# Altium footprint library Global Library.PcbLib: 97 footprints (part 3 of 7)
Each footprint in its own frame and in the unit in brackets; x right, y up, seen from the top. Pads: shape width x height; smd on the part's side, far side on the other; paste and mask are expansions set on the pad; w line width, h text height; cw(c..) or ccw(c..) is an arc to the next point about the centre after c.
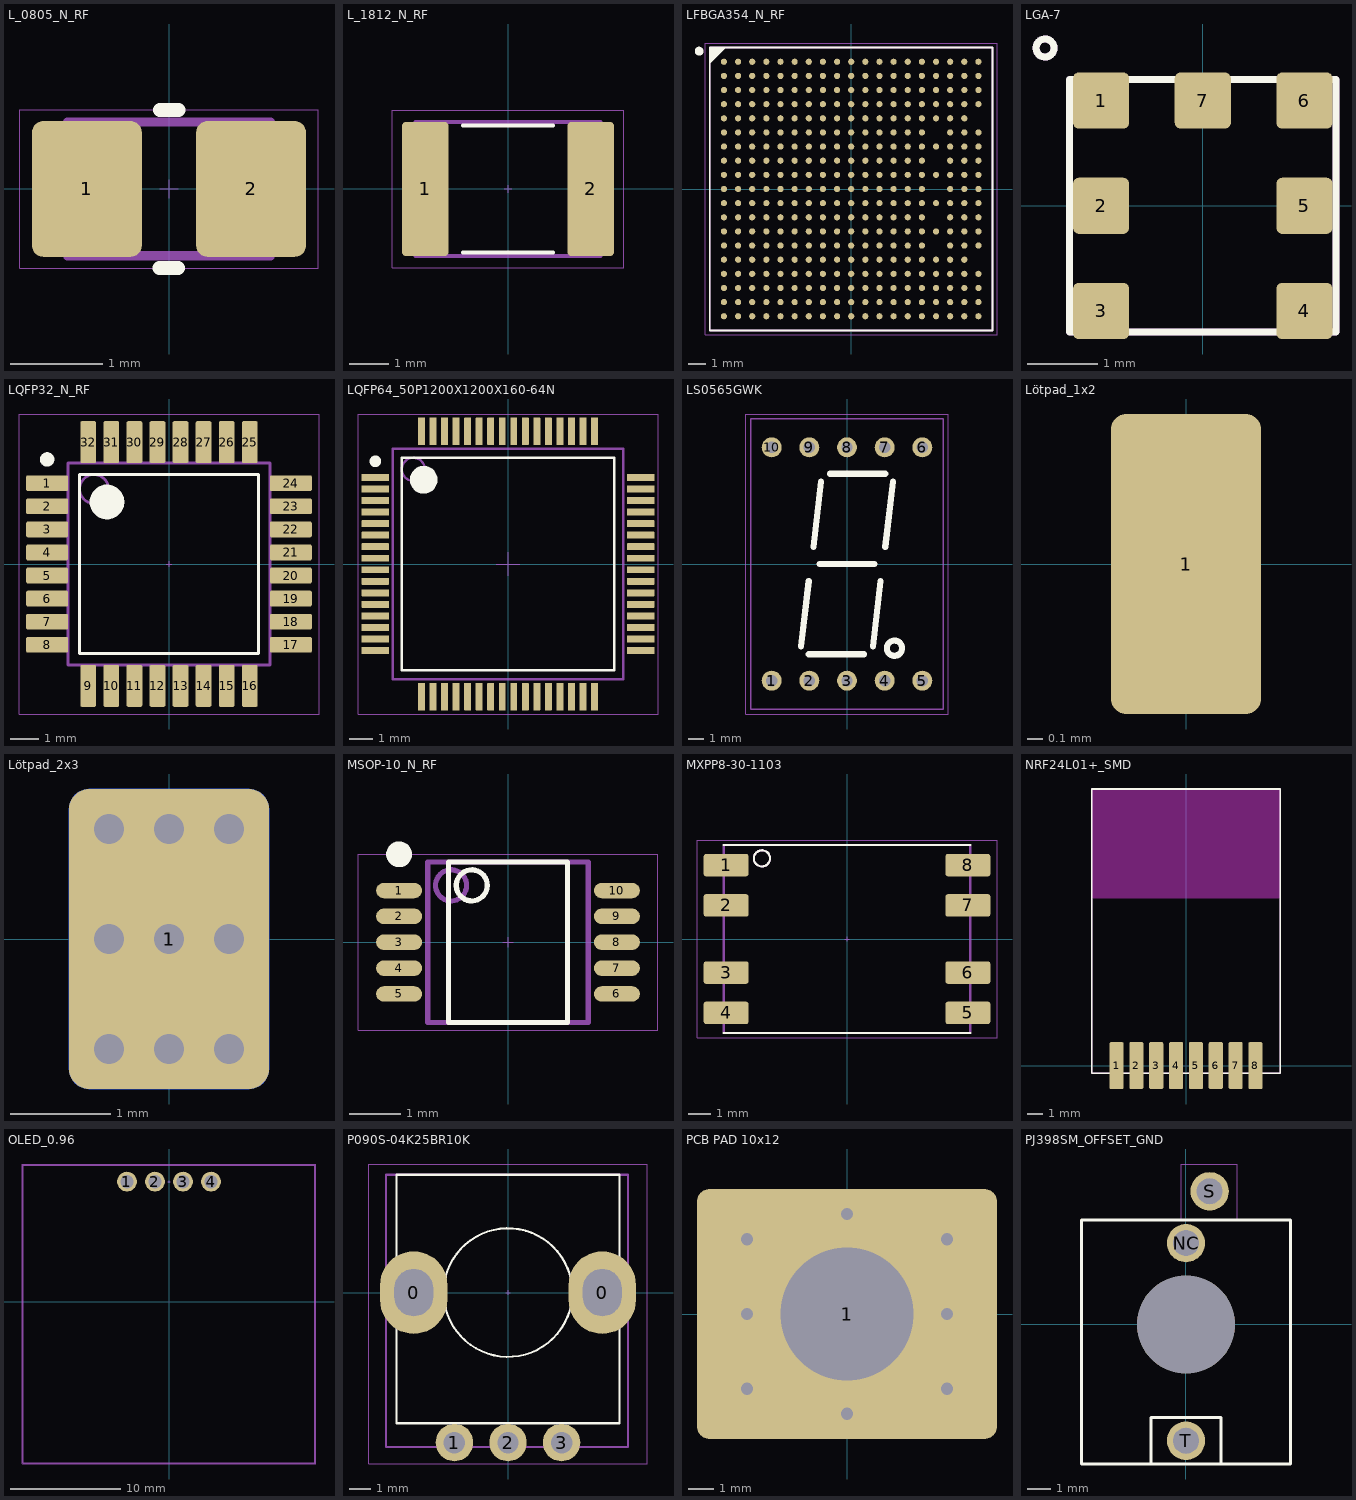
[diagram p2: the footprints below, top view; thin cyan lines are the x and y axes]

## L_0805_N_RF [mm]
pads (2):
  rrect20% 1.19x1.47 smd: 1(-0.89,0) 2(0.89,0)
Top Overlay:
  lines w0.15: -0.101,-0.857 0.099,-0.857 ; -0.099,0.857 0.101,0.857
Top Courtyard:
  lines w0.01: -0.1,0 0.1,0 ; 0,-0.1 0,0.1 ; -1.618,-0.858 1.615,-0.858 1.615,0.857 -1.618,0.857 -1.618,-0.858
Top Assembly:
  lines w0.1: -1.1,-0.725 1.1,-0.725 1.1,0.725 -1.1,0.725 -1.1,-0.725
Top Assy SMT:
  lines w0.1: -1.1,-0.725 1.1,-0.725 1.1,0.725 -1.1,0.725 -1.1,-0.725
  text ".Designator" at -1.1,1 h1
3D body "INDC0805X09L.step": height 0.9, standoff 0, extent -1.1,-0.725 1.1,0.725

## L_1812_N_RF [mm] "Chip Inductor, 2-Leads, Body 4.50x3.20mm, IPC Medium Density"
height 1.7
pads (2):
  rrect20% 1.19x3.42 smd: 1(-2.105,0) 2(2.105,0)
Top Overlay:
  lines w0.1: -1.15,-1.61 1.15,-1.61 ; -1.15,1.61 1.15,1.61
Top Courtyard:
  lines w0.01: -0.1,0 0.1,0 ; 0,-0.1 0,0.1 ; -2.95,-2 2.95,-2 2.95,2 -2.95,2 -2.95,-2
Top Assembly:
  lines w0.1: -2.35,-1.7 2.35,-1.7 2.35,1.7 -2.35,1.7 -2.35,-1.7
Top Assy SMT:
  lines w0.1: -2.35,-1.7 2.35,-1.7 2.35,1.7 -2.35,1.7 -2.35,-1.7
  text ".Designator" at -2.6,2.1 h1
3D body "L_1812_N_RF.step": height 1.7, standoff 0, extent -2.35,-1.7 2.35,1.7

## LFBGA354_N_RF [mm] "BGA, 354-Leads, Body 16.00x16.00mmx1.29mm, Pitch 0.80mm"
height 1.29
pads (354):
  round 0.35 smd: A1(-7.2,7.2) A2(-6.4,7.2) A3(-5.6,7.2) A4(-4.8,7.2) A5(-4,7.2) A6(-3.2,7.2) A7(-2.4,7.2) A8(-1.6,7.2) A9(-0.8,7.2) A10(0,7.2) A11(0.8,7.2) A12(1.6,7.2) A13(2.4,7.2) A14(3.2,7.2) A15(4,7.2) A16(4.8,7.2) A17(5.6,7.2) A18(6.4,7.2) A19(7.2,7.2) B1(-7.2,6.4) B2(-6.4,6.4) B3(-5.6,6.4) B4(-4.8,6.4) B5(-4,6.4) B6(-3.2,6.4) B7(-2.4,6.4) B8(-1.6,6.4) B9(-0.8,6.4) B10(0,6.4) B11(0.8,6.4) B12(1.6,6.4) B13(2.4,6.4) B14(3.2,6.4) B15(4,6.4) B16(4.8,6.4) B17(5.6,6.4) B18(6.4,6.4) B19(7.2,6.4) C1(-7.2,5.6) C2(-6.4,5.6) C3(-5.6,5.6) C4(-4.8,5.6) C5(-4,5.6) C6(-3.2,5.6) C7(-2.4,5.6) C8(-1.6,5.6) C9(-0.8,5.6) C10(0,5.6) C11(0.8,5.6) C12(1.6,5.6) C13(2.4,5.6) C14(3.2,5.6) C15(4,5.6) C16(4.8,5.6) C17(5.6,5.6) C18(6.4,5.6) C19(7.2,5.6) D1(-7.2,4.8) D2(-6.4,4.8) D3(-5.6,4.8) D4(-4.8,4.8) D5(-4,4.8) D6(-3.2,4.8) D7(-2.4,4.8) D8(-1.6,4.8) D9(-0.8,4.8) D10(0,4.8) D11(0.8,4.8) D12(1.6,4.8) D13(2.4,4.8) D14(3.2,4.8) D15(4,4.8) D16(4.8,4.8) D17(5.6,4.8) D18(6.4,4.8) D19(7.2,4.8) E1(-7.2,4) E2(-6.4,4) E3(-5.6,4) E4(-4.8,4) E5(-4,4) E6(-3.2,4) E7(-2.4,4) E8(-1.6,4) E9(-0.8,4) E10(0,4) E11(0.8,4) E12(1.6,4) E13(2.4,4) E14(3.2,4) E15(4,4) E16(4.8,4) E17(5.6,4) E18(6.4,4) F1(-7.2,3.2) F2(-6.4,3.2) F3(-5.6,3.2) F4(-4.8,3.2) F5(-4,3.2) F6(-3.2,3.2) F7(-2.4,3.2) F8(-1.6,3.2) F9(-0.8,3.2) F10(0,3.2) F11(0.8,3.2) F12(1.6,3.2) F13(2.4,3.2) F14(3.2,3.2) F15(4,3.2) F17(5.6,3.2) F18(6.4,3.2) F19(7.2,3.2) G1(-7.2,2.4) G2(-6.4,2.4) G3(-5.6,2.4) G4(-4.8,2.4) G5(-4,2.4) G6(-3.2,2.4) G7(-2.4,2.4) G8(-1.6,2.4) G9(-0.8,2.4) G10(0,2.4) G11(0.8,2.4) G12(1.6,2.4) G13(2.4,2.4) G14(3.2,2.4) G15(4,2.4) G16(4.8,2.4) G17(5.6,2.4) G18(6.4,2.4) G19(7.2,2.4) H1(-7.2,1.6) H2(-6.4,1.6) H3(-5.6,1.6) H4(-4.8,1.6) H5(-4,1.6) H6(-3.2,1.6) H7(-2.4,1.6) H8(-1.6,1.6) H9(-0.8,1.6) H10(0,1.6) H11(0.8,1.6) H12(1.6,1.6) H13(2.4,1.6) H14(3.2,1.6) H15(4,1.6) H17(5.6,1.6) H18(6.4,1.6) H19(7.2,1.6) J1(-7.2,0.8) J2(-6.4,0.8) J3(-5.6,0.8) J4(-4.8,0.8) J5(-4,0.8) J6(-3.2,0.8) J7(-2.4,0.8) J8(-1.6,0.8) J9(-0.8,0.8) J10(0,0.8) J11(0.8,0.8) J12(1.6,0.8) J13(2.4,0.8) J14(3.2,0.8) J15(4,0.8) J16(4.8,0.8) J17(5.6,0.8) J18(6.4,0.8) J19(7.2,0.8) K1(-7.2,0) K2(-6.4,0) K3(-5.6,0) K4(-4.8,0) K5(-4,0) K6(-3.2,0) K7(-2.4,0) K8(-1.6,0) K9(-0.8,0) K10(0,0) K11(0.8,0) K12(1.6,0) K13(2.4,0) K14(3.2,0) K15(4,0) K17(5.6,0) K18(6.4,0) K19(7.2,0) L1(-7.2,-0.8) L2(-6.4,-0.8) L3(-5.6,-0.8) L4(-4.8,-0.8) L5(-4,-0.8) L6(-3.2,-0.8) L7(-2.4,-0.8) L8(-1.6,-0.8) L9(-0.8,-0.8) L10(0,-0.8) L11(0.8,-0.8) L12(1.6,-0.8) L13(2.4,-0.8) L14(3.2,-0.8) L15(4,-0.8) L16(4.8,-0.8) L17(5.6,-0.8) L18(6.4,-0.8) L19(7.2,-0.8) M1(-7.2,-1.6) M2(-6.4,-1.6) M3(-5.6,-1.6) M4(-4.8,-1.6) M5(-4,-1.6) M6(-3.2,-1.6) M7(-2.4,-1.6) M8(-1.6,-1.6) M9(-0.8,-1.6) M10(0,-1.6) M11(0.8,-1.6) M12(1.6,-1.6) M13(2.4,-1.6) M14(3.2,-1.6) M15(4,-1.6) M17(5.6,-1.6) M18(6.4,-1.6) M19(7.2,-1.6) N1(-7.2,-2.4) N2(-6.4,-2.4) N3(-5.6,-2.4) N4(-4.8,-2.4) N5(-4,-2.4) N6(-3.2,-2.4) N7(-2.4,-2.4) N8(-1.6,-2.4) N9(-0.8,-2.4) N10(0,-2.4) N11(0.8,-2.4) N12(1.6,-2.4) N13(2.4,-2.4) N14(3.2,-2.4) N15(4,-2.4) N16(4.8,-2.4) N17(5.6,-2.4) N18(6.4,-2.4) N19(7.2,-2.4) P1(-7.2,-3.2) P2(-6.4,-3.2) P3(-5.6,-3.2) P4(-4.8,-3.2) P5(-4,-3.2) P6(-3.2,-3.2) P7(-2.4,-3.2) P8(-1.6,-3.2) P9(-0.8,-3.2) P10(0,-3.2) P11(0.8,-3.2) P12(1.6,-3.2) P13(2.4,-3.2) P14(3.2,-3.2) P15(4,-3.2) P17(5.6,-3.2) P18(6.4,-3.2) P19(7.2,-3.2) R1(-7.2,-4) R2(-6.4,-4) R3(-5.6,-4) R4(-4.8,-4) R5(-4,-4) R6(-3.2,-4) R7(-2.4,-4) R8(-1.6,-4) R9(-0.8,-4) R10(0,-4) R11(0.8,-4) R12(1.6,-4) R13(2.4,-4) R14(3.2,-4) R15(4,-4) R16(4.8,-4) R17(5.6,-4) R18(6.4,-4) T1(-7.2,-4.8) T2(-6.4,-4.8) T3(-5.6,-4.8) T4(-4.8,-4.8) T5(-4,-4.8) T6(-3.2,-4.8) T7(-2.4,-4.8) T8(-1.6,-4.8) T9(-0.8,-4.8) T10(0,-4.8) T11(0.8,-4.8) T12(1.6,-4.8) T13(2.4,-4.8) T14(3.2,-4.8) T15(4,-4.8) T16(4.8,-4.8) T17(5.6,-4.8) T18(6.4,-4.8) T19(7.2,-4.8) U1(-7.2,-5.6) U2(-6.4,-5.6) U3(-5.6,-5.6) U4(-4.8,-5.6) U5(-4,-5.6) U6(-3.2,-5.6) U7(-2.4,-5.6) U8(-1.6,-5.6) U9(-0.8,-5.6) U10(0,-5.6) U11(0.8,-5.6) U12(1.6,-5.6) U13(2.4,-5.6) U14(3.2,-5.6) U15(4,-5.6) U16(4.8,-5.6) U17(5.6,-5.6) U18(6.4,-5.6) U19(7.2,-5.6) V1(-7.2,-6.4) V2(-6.4,-6.4) V3(-5.6,-6.4) V4(-4.8,-6.4) V5(-4,-6.4) V6(-3.2,-6.4) V7(-2.4,-6.4) V8(-1.6,-6.4) V9(-0.8,-6.4) V10(0,-6.4) V11(0.8,-6.4) V12(1.6,-6.4) V13(2.4,-6.4) V14(3.2,-6.4) V15(4,-6.4) V16(4.8,-6.4) V17(5.6,-6.4) V18(6.4,-6.4) V19(7.2,-6.4) W1(-7.2,-7.2) W2(-6.4,-7.2) W3(-5.6,-7.2) W4(-4.8,-7.2) W5(-4,-7.2) W6(-3.2,-7.2) W7(-2.4,-7.2) W8(-1.6,-7.2) W9(-0.8,-7.2) W10(0,-7.2) W11(0.8,-7.2) W12(1.6,-7.2) W13(2.4,-7.2) W14(3.2,-7.2) W15(4,-7.2) W16(4.8,-7.2) W17(5.6,-7.2) W18(6.4,-7.2) W19(7.2,-7.2)
Top Overlay:
  circle w0.25: c-8.6,7.8 r0.125
  region: -7.142,8 -8,7.142 -8,8
  lines w0.1: -8,7.142 -7.142,8 ; -8,-8 8,-8 8,8 -8,8 -8,-8
Top Courtyard:
  lines w0.01: -0.1,0 0.1,0 ; 0,-0.1 0,0.1 ; -8.25,-8.25 8.25,-8.25 8.25,8.25 -8.25,8.25 -8.25,-8.25
Top Assembly:
  lines w0.1: -8,-8 8,-8 8,8 -8,8 -8,-8
Top Assy SMT:
  text ".Designator" at -8.1,8.4 h1
3D body "LFBGA354_N_RF.step": height 1.29, standoff 0, extent -8,-8 8,8

## LGA-7 [mm]
pads (7):
  rrect20% 0.8x0.8 smd: 1(-1.45,1.5) 2(-1.45,0) 3(-1.45,-1.5) 4(1.45,-1.5) 5(1.45,0) 6(1.45,1.5) 7(0,1.5)
Top Overlay:
  circle w0.1: c-2.25,2.25 r0.129
  lines w0.1: -1.9,-1.8 1.9,-1.8 1.9,1.8 -1.9,1.8 -1.9,-1.8
Top Assembly:
  circle w0.1: c-2.25,2.25 r0.129
  lines w0.1: -1.9,-1.8 -1.9,1.8 1.9,1.8 1.9,-1.8 -1.9,-1.8
Top Assy SMT:
  circle w0.1: c-2.25,2.25 r0.129
  lines w0.1: -1.9,-1.8 -1.9,1.8 1.9,1.8 1.9,-1.8 -1.9,-1.8
  text ".Designator" at -2.211,-0.179 h1
3D body "User Library-BMP180_F.step": height 0.98, standoff 0, extent -1.9,-1.8 1.9,1.8

## LQFP32_N_RF [mm] "TQFP, 32-Leads, Body 7.00x7.00mm, Pitch 0.80mm, IPC Medium Density"
height 1.6
pads (32):
  rrect20% 1.45x0.55 smd: 1(-4.225,2.8) 2(-4.225,2) 3(-4.225,1.2) 4(-4.225,0.4) 5(-4.225,-0.4) 6(-4.225,-1.2) 7(-4.225,-2) 8(-4.225,-2.8) 17(4.225,-2.8) 18(4.225,-2) 19(4.225,-1.2) 20(4.225,-0.4) 21(4.225,0.4) 22(4.225,1.2) 23(4.225,2) 24(4.225,2.8)
  rrect20% 0.55x1.45 smd: 9(-2.8,-4.225) 10(-2,-4.225) 11(-1.2,-4.225) 12(-0.4,-4.225) 13(0.4,-4.225) 14(1.2,-4.225) 15(2,-4.225) 16(2.8,-4.225) 25(2.8,4.225) 26(2,4.225) 27(1.2,4.225) 28(0.4,4.225) 29(-0.4,4.225) 30(-1.2,4.225) 31(-2,4.225) 32(-2.8,4.225)
Top Overlay:
  circle w0.25: c-4.225,3.625 r0.125
  circle w0.6: c-2.15,2.15 r0.3
  lines w0.1: -3.1,-3.1 -3.1,3.1 3.1,3.1 3.1,-3.1 -3.1,-3.1
Top Courtyard:
  lines w0.01: -0.1,0 0.1,0 ; 0,-0.1 0,0.1 ; -5.2,-5.2 -5.2,5.2 5.2,5.2 5.2,-5.2 -5.2,-5.2
Top Assembly:
  circle w0.1: c-2.6,2.6 r0.5
  lines w0.1: -3.5,-3.5 -3.5,3.5 3.5,3.5 3.5,-3.5 -3.5,-3.5
Top Assy SMT:
  circle w0.1: c-2.6,2.6 r0.5
  lines w0.1: -3.5,-3.5 -3.5,3.5 3.5,3.5 3.5,-3.5 -3.5,-3.5
  text ".Designator" at -2.413,-0.221 h1
3D body "LQFP32_N_RF.step": height 1.6, standoff 0, extent -4.5,-4.5 4.5,4.5

## LQFP64_50P1200X1200X160-64N [mm] "LQFP, 64-Leads, Body 10.00x10.00mm, Pitch 0.50mm, IPC Medium Density"
height 1.6
pads (64):
  rrect20% 1.2x0.3 smd: 1(-5.75,3.75) 2(-5.75,3.25) 3(-5.75,2.75) 4(-5.75,2.25) 5(-5.75,1.75) 6(-5.75,1.25) 7(-5.75,0.75) 8(-5.75,0.25) 9(-5.75,-0.25) 10(-5.75,-0.75) 11(-5.75,-1.25) 12(-5.75,-1.75) 13(-5.75,-2.25) 14(-5.75,-2.75) 15(-5.75,-3.25) 16(-5.75,-3.75) 33(5.75,-3.75) 34(5.75,-3.25) 35(5.75,-2.75) 36(5.75,-2.25) 37(5.75,-1.75) 38(5.75,-1.25) 39(5.75,-0.75) 40(5.75,-0.25) 41(5.75,0.25) 42(5.75,0.75) 43(5.75,1.25) 44(5.75,1.75) 45(5.75,2.25) 46(5.75,2.75) 47(5.75,3.25) 48(5.75,3.75)
  rrect20% 0.3x1.2 smd: 17(-3.75,-5.75) 18(-3.25,-5.75) 19(-2.75,-5.75) 20(-2.25,-5.75) 21(-1.75,-5.75) 22(-1.25,-5.75) 23(-0.75,-5.75) 24(-0.25,-5.75) 25(0.25,-5.75) 26(0.75,-5.75) 27(1.25,-5.75) 28(1.75,-5.75) 29(2.25,-5.75) 30(2.75,-5.75) 31(3.25,-5.75) 32(3.75,-5.75) 49(3.75,5.75) 50(3.25,5.75) 51(2.75,5.75) 52(2.25,5.75) 53(1.75,5.75) 54(1.25,5.75) 55(0.75,5.75) 56(0.25,5.75) 57(-0.25,5.75) 58(-0.75,5.75) 59(-1.25,5.75) 60(-1.75,5.75) 61(-2.25,5.75) 62(-2.75,5.75) 63(-3.25,5.75) 64(-3.75,5.75)
Top Overlay:
  circle w0.25: c-5.75,4.45 r0.125
  circle w0.6: c-3.65,3.65 r0.3
  lines w0.1: -4.6,-4.6 -4.6,4.6 4.6,4.6 4.6,-4.6 -4.6,-4.6
Top Courtyard:
  lines w0.01: -0.5,0 0.5,0 ; 0,-0.5 0,0.5 ; -6.5,-6.5 -6.5,6.5 6.5,6.5 6.5,-6.5 -6.5,-6.5
Top Assembly:
  circle w0.1: c-4.1,4.1 r0.5
  lines w0.1: -5,-5 -5,5 5,5 5,-5 -5,-5
Top Assy SMT:
  circle w0.1: c-4.1,4.1 r0.5
  lines w0.1: -5,-5 -5,5 5,5 5,-5 -5,-5
  text ".Designator" at -2.413,-0.221 h1
3D body "LQFP-64.step": height 1.6, standoff 0, extent -6.007,-6.007 6.007,6.007

## LS0565GWK [mm]
pads (10):
  round 1.3 hole 0.75: 1(-4.92,-7.62) 2(-2.46,-7.62) 3(0,-7.62) 4(2.46,-7.62) 5(4.92,-7.62) 6(4.92,7.62) 7(2.46,7.62) 8(0,7.62) 9(-2.46,7.62) 10(-4.92,7.62)
Top Overlay:
  circle w0.4: c3.1,-5.5 r0.5
  lines w0.4: -3,-5.4 -2.5,-1.1 ; -2.5,-5.9 1.1,-5.9 ; -2.2,1.1 -1.7,5.4 ; -1.8,0 1.8,0 ; -1.1,5.9 2.5,5.9 ; 1.7,-5.4 2.2,-1.1 ; 2.5,1.1 3,5.4
Top Courtyard:
  lines w0.01: -0.1,0 0.1,0 ; 0,-0.1 0,0.1 ; -6.6,-9.8 -6.6,9.8 6.6,9.8 6.6,-9.8 -6.6,-9.8
Top Assembly:
  lines w0.1: -6.3,-9.5 -6.3,9.5 6.3,9.5 6.3,-9.5 -6.3,-9.5
Top Assy THT:
  lines w0.1: -6.3,-9.5 -6.3,9.5 6.3,9.5 6.3,-9.5 -6.3,-9.5
  text ".Designator" at -6.342,10.179 h2
3D body: height 8, standoff 0, extent -6.3,-9.5 6.3,9.5

## Lötpad_1x2 [mm]
pads (1):
  rrect20% 1x2 smd: 1(0,0)

## Lötpad_2x3 [mm]
pads (2):
  rrect20% 2x3 smd: 1(0,0)
  rrect20% 2x3 smd far side: 1(0,0)
via 0.6,1.1 diameter 0.7 hole 0.3
via 0,1.1 diameter 0.7 hole 0.3
via -0.6,1.1 diameter 0.7 hole 0.3
via 0,0 diameter 0.7 hole 0.3
via -0.6,0 diameter 0.7 hole 0.3
via -0.6,-1.1 diameter 0.7 hole 0.3
via 0,-1.1 diameter 0.7 hole 0.3
via 0.6,-1.1 diameter 0.7 hole 0.3
via 0.6,0 diameter 0.7 hole 0.3

## MSOP-10_N_RF [mm] "TSSOP, 10-Leads, Body 3.00x3.00mm, Pitch 0.50mm, IPC Medium Density"
height 1.1
pads (10):
  oval 0.89x0.3 smd: 1(-2.105,1) 2(-2.105,0.5) 3(-2.105,0) 4(-2.105,-0.5) 5(-2.105,-1) 6(2.105,-1) 7(2.105,-0.5) 8(2.105,0) 9(2.105,0.5) 10(2.105,1)
Top Overlay:
  circle w0.25: c-2.105,1.7 r0.125
  circle w0.1: c-0.7,1.1 r0.3
  lines w0.1: -1.15,-1.55 -1.15,1.55 1.15,1.55 1.15,-1.55 -1.15,-1.55
Top Courtyard:
  lines w0.01: -0.1,0 0.1,0 ; 0,-0.1 0,0.1 ; -2.9,-1.7 -2.9,1.7 2.9,1.7 2.9,-1.7 -2.9,-1.7
Top Assembly:
  circle w0.1: c-1.1,1.1 r0.3
  lines w0.1: -1.55,-1.55 -1.55,1.55 1.55,1.55 1.55,-1.55 -1.55,-1.55
Top Assy SMT:
  circle w0.1: c-1.1,1.1 r0.3
  lines w0.1: -1.55,-1.55 -1.55,1.55 1.55,1.55 1.55,-1.55 -1.55,-1.55
  text ".Designator" at -2.413,-0.221 h1
3D body "MSOP-10_N_RF.step": height 1.1, standoff 0, extent -2.45,-1.55 2.45,1.55

## MXPP8-30-1103 [mm]
height 3.2
pads (8):
  rrect20% 2x1 smd: 1(-5.4,3.3) 2(-5.4,1.5) 3(-5.4,-1.5) 4(-5.4,-3.3) 5(5.4,-3.3) 6(5.4,-1.5) 7(5.4,1.5) 8(5.4,3.3)
Top Overlay:
  circle w0.1: c-3.8,3.6 r0.361
  lines w0.1: -5.5,-4.2 5.5,-4.2 ; -5.5,4.2 5.5,4.2
Top Courtyard:
  lines w0.01: -0.1,0 0.1,0 ; 0,-0.1 0,0.1 ; -6.7,-4.4 6.7,-4.4 6.7,4.4 -6.7,4.4 -6.7,-4.4
Top Assembly:
  circle w0.1: c-3.8,3.6 r0.361
  lines w0.1: -5.5,-4.2 -5.5,4.2 5.5,4.2 5.5,-4.2 -5.5,-4.2
Top Assy SMT:
  circle w0.1: c-3.8,3.6 r0.361
  lines w0.1: -5.5,-4.2 -5.5,4.2 5.5,4.2 5.5,-4.2 -5.5,-4.2
  text ".Designator" at -2.89,-0.265 h1.2
3D body: height 3.1, standoff 0, extent -5.5,-4.2 5.5,4.2

## NRF24L01+_SMD [mm]
pads (8):
  rrect20% 0.9x3 smd: 1(-4.445,0) 2(-3.175,0) 3(-1.905,0) 4(-0.635,0) 5(0.635,0) 6(1.905,0) 7(3.175,0) 8(4.445,0)
Top Overlay:
  lines w0.1: -6.045,-0.5 -6.045,17.7 6.045,17.7 6.045,-0.5 -6.045,-0.5
Keep-Out Layer:
  rectangle: -6.045,10.7 6.045,17.7
Top Assembly:
  lines w0.1: -6.045,-0.5 6.045,-0.5 6.045,17.7 -6.045,17.7 -6.045,-0.5
Top Assy SMT:
  lines w0.1: -6.045,-0.5 6.045,-0.5 6.045,17.7 -6.045,17.7 -6.045,-0.5
  text ".Designator" at -2.89,3.935 h1.2
3D body "User Library-nRF24L01-Mini.step": height 0.8, standoff 0, extent -6.05,-0.5 5.95,17.5

## OLED_0.96 [mm]
pads (4):
  round 1.8 hole 1.2: 1(-3.81,10.9) 2(-1.27,10.9) 3(1.27,10.9) 4(3.81,10.9)
Top Courtyard:
  lines w0.01: -0.1,10.9 0.1,10.9 ; 0,10.8 0,11 ; -13.3,-14.7 -13.3,12.5 13.3,12.5 13.3,-14.7 -13.3,-14.7
Top Assembly:
  lines w0.1: -13.2,-14.6 13.2,-14.6 13.2,12.4 -13.2,12.4 -13.2,-14.6
Top Assy THT:
  lines w0.1: -13.2,-14.6 13.2,-14.6 13.2,12.4 -13.2,12.4 -13.2,-14.6
  text ".Designator" at -12.942,12.979 h2
3D body "Display_OLED_0.96_128x64.step": height 5.5, standoff -6.1, extent -13.1,-14.597 13.1,12.4

## P090S-04K25BR10K [mm] "Potentiometer"
pads (5):
  oval 3.15x3.85 hole 1.8 slot 2.2 at 90 deg: 0(-4.4,0) 0(4.4,0)
  round 1.75 hole 1: 1(-2.5,-7) 2(0,-7) 3(2.5,-7)
Top Overlay:
  circle w0.1: c0,0 r3
  lines w0.1: -5.2,-6.1 5.2,-6.1 5.2,5.5 -5.2,5.5 -5.2,-6.1
Top Courtyard:
  lines w0.01: -0.1,0 0.1,0 ; 0,-0.1 0,0.1 ; -6.5,-8 -6.5,6 6.5,6 6.5,-8 -6.5,-8
Top Assembly:
  lines w0.1: -5.7,-7.2 -5.7,5.5 5.6,5.5 5.6,-7.2 -5.7,-7.2
Top Assy SMT:
  lines w0.1: -5.7,-7.2 5.6,-7.2 5.6,5.5 -5.7,5.5 -5.7,-7.2
Top Assy THT:
  text ".Designator" at -5.235,6.175 h1
3D body "User Library-P090S-topadjust.step": height 21.1, standoff -2.92, extent -5.637,-7.15 5.637,5.5

## PCB PAD 10x12 [mm] "PCB Pad for screw on terminal lug"
pads (1):
  rrect10% 12x10 hole 5.3: 1(0,0)
via 0,-4 diameter 1 hole 0.5
via 0,4 diameter 1 hole 0.5
via 4,3 diameter 1 hole 0.5
via 4,0 diameter 1 hole 0.5
via 4,-3 diameter 1 hole 0.5
via -4,-3 diameter 1 hole 0.5
via -4,3 diameter 1 hole 0.5
via -4,0 diameter 1 hole 0.5

## PJ398SM_OFFSET_GND [mm]
pads (4):
  round 1.65 hole 1.1 slot 1.1 at 0 deg: NC(0,3.5) S(1.016,5.727) T(0,-5)
  round 4.2 hole 4.2 unplated: ""(0,0)
Top Overlay:
  lines w0.127: -1.5,-6 1.5,-6 ; -1.5,-6 -4.5,-6 -4.5,4.5 -0.2,4.5 4.5,4.5 4.5,-6 1.5,-6 ; -1.5,-6 -1.5,-4 1.5,-4 1.5,-6
Top Courtyard:
  lines w0.01: -0.1,0 0.1,0 ; 0,-0.1 0,0.1 ; -4.5,-6 -4.5,4.5 -0.2,4.5 -0.2,6.9 2.2,6.9 2.2,4.5 4.5,4.5 4.5,-6 -4.5,-6
Top Assy THT:
  text ".Designator" at -4.975,-5.935 h1
3D body "PJ301M-12 Thonkiconn v0.2.stp": height 14.51, standoff -3.51, extent -4.5,-6.012 4.5,6.618